# Altium schematic symbol library TI - ADC.SchLib: 2198 symbols (part 22 of 130)
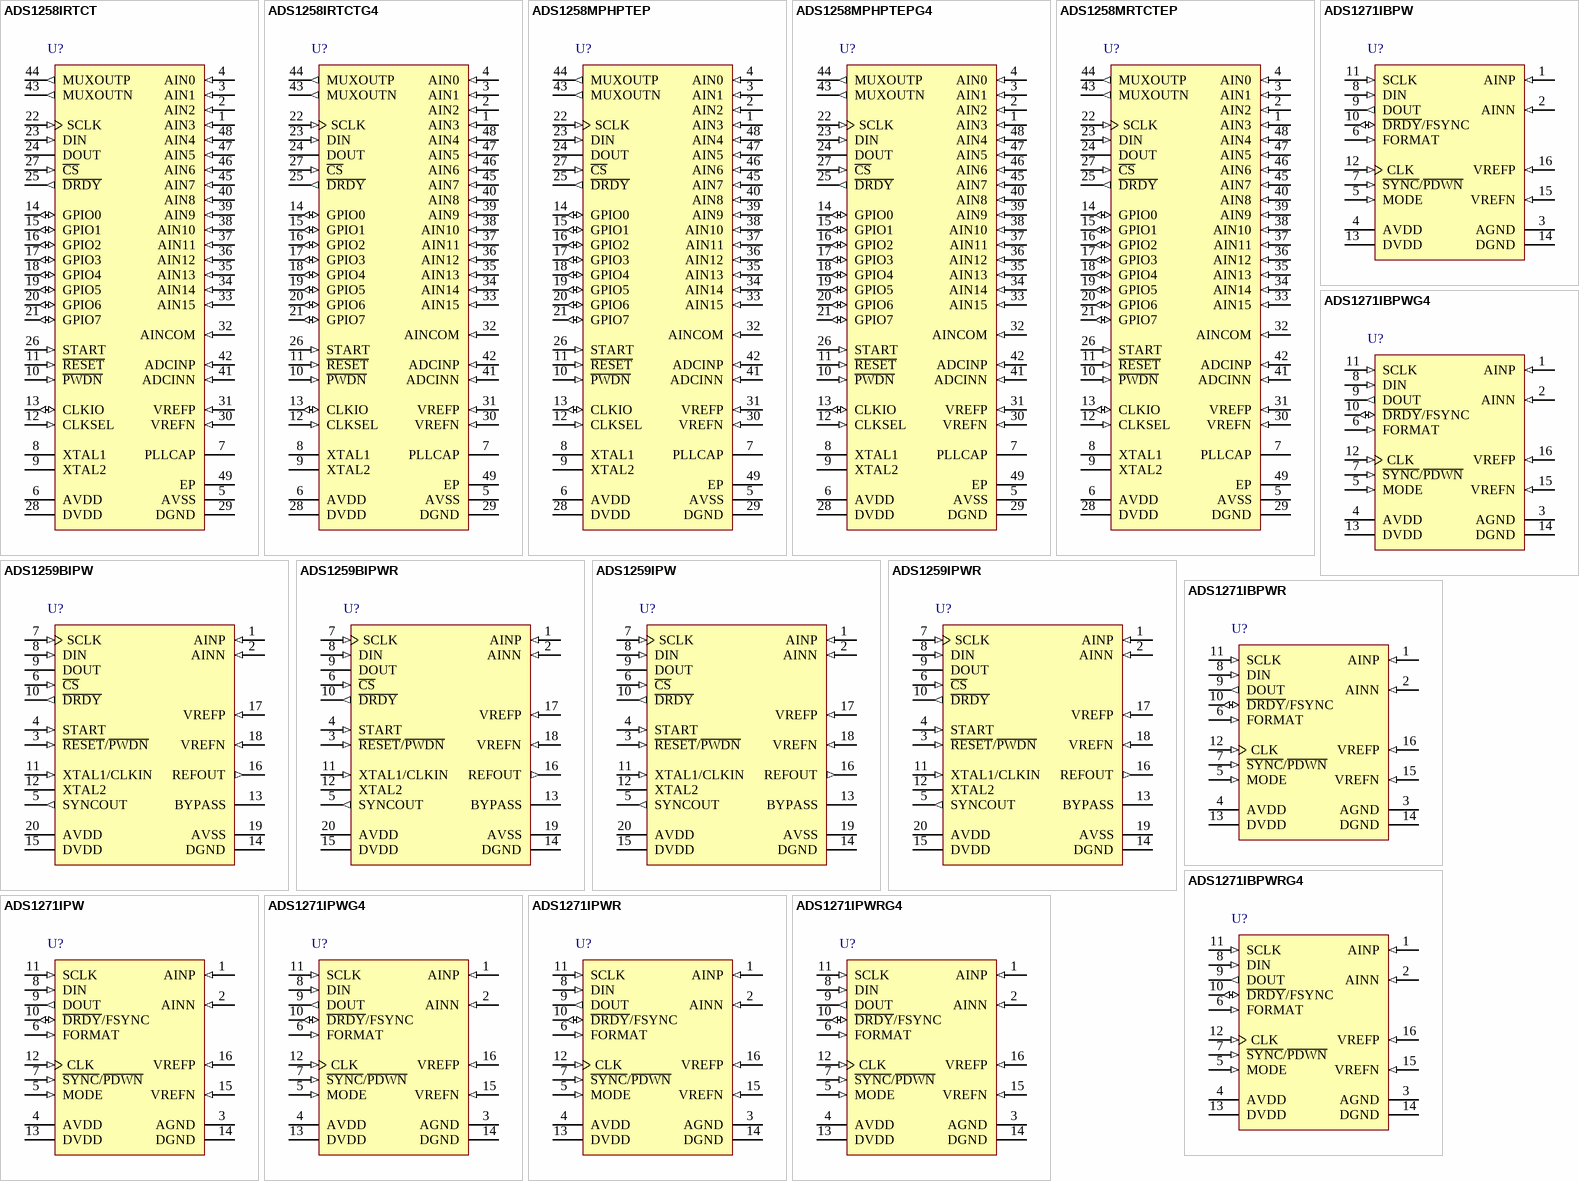
[diagram p147: symbols ADS1258IRTCT to ADS1271IPWRG4]

## ADS1259BIPW
designator U?
Low-Noise, 14 kSPS, 24-Bit ADC, -40 to 105 degC, 20-pin SOP (PW20), Green (RoHS & no Sb/Br); Manufacturer: Texas Instruments; PartNumber: ADS1259BIPW; # Input Channels: 1; Analog Voltage AV/DD(Max)(V): 5.25; Analog Voltage AV/DD(Min)(V): 4.75; Architecture: Delta-Sigma; Digital Supply(Min)(V): 2.7; Interface: Serial SPI; Resolution(Bits): 24; Sample Rate (max)(SPS): 14.4K; SubFamily: Precision ADC (<=10MSPS); DatasheetVersion: SBAS424D; PackageVersion: 4040064-5/G, 02/2011; PackageReference: PW20; PackageDescription: 20-Pin Plastic Small Outline, Body 6.5 x 4.4 mm, Pitch 0.65 mm; Supplier 1: Digi-Key; Supplier Part Number 1: TLC3548IPWRG4-ND; Digital Supply(Max)(V): 5.25; Eco-Plan: Green (RoHS & no Sb/Br); Mounting Technology: Surface Mount; Code_JEDEC: MO-153; ComponentLink1Description: Manufacturer URL; ComponentLink1URL: http://www.ti.com/; ComponentLink2Description: Datasheet; ComponentLink2URL: http://www.ti.com/general/docs/lit/getliterature.tsp?genericPartNumber=ADS1259&fileType=pdf; ComponentLink3Description: Package Specification; ComponentLink3URL: http://www.ti.com.cn/cn/lit/ml/mpds362/mpds362.pdf
footprint TI-PW20_N (SOP, 20-Leads, Body 6.5x4.4mm, Pitch 0.65mm, IPC Medium Density)
footprint TI-PW20_L (SOP, 20-Leads, Body 6.5x4.4mm, Pitch 0.65mm, IPC High Density)
footprint TI-PW20_M (SOP, 20-Leads, Body 6.5x4.4mm, Pitch 0.65mm, IPC Low Density)
pins: 1 AINP (in) "Positive analog input", 2 AINN (in) "Negative analog input", 3 ~{RESET}/~{PWDN} (in), 4 START (in) "Start conversions, active high", 5 SYNCOUT (out) "Sync clock output (fCLK/8)", 6 ~{CS} (in) "SPI chip-select, active low", 7 SCLK (in) "SPI clock input", 8 DIN (in) "SPI data input", 9 DOUT (hiz) "SPI data output", 10 ~{DRDY} (out) "Data ready output, active low", 11 XTAL1/CLKIN (in), 12 XTAL2 "External crystal2, otherwise no connection", 13 BYPASS "Core voltage bypass", 14 DGND (power) "Digital ground", 15 DVDD (power) "Digital power supply", 16 REFOUT (out) "Positive reference output", 17 VREFP (in) "Positive reference input", 18 VREFN (in) "Negative reference input", 19 AVSS (power) "Negative analog power supply and negative reference output", 20 AVDD (power) "Positive analog power supply"

## ADS1259BIPWR
designator U?
Low-Noise, 14 kSPS, 24-Bit ADC, -40 to 105 degC, 20-pin SOP (PW20), Green (RoHS & no Sb/Br); Manufacturer: Texas Instruments; PartNumber: ADS1259BIPWR; # Input Channels: 1; Analog Voltage AV/DD(Max)(V): 5.25; Analog Voltage AV/DD(Min)(V): 4.75; Architecture: Delta-Sigma; Digital Supply(Min)(V): 2.7; Interface: Serial SPI; Resolution(Bits): 24; Sample Rate (max)(SPS): 14.4K; SubFamily: Precision ADC (<=10MSPS); DatasheetVersion: SBAS424D; PackageVersion: 4040064-5/G, 02/2011; PackageReference: PW20; PackageDescription: 20-Pin Plastic Small Outline, Body 6.5 x 4.4 mm, Pitch 0.65 mm; Supplier 1: Digi-Key; Supplier Part Number 1: 296-2988-5-ND; Digital Supply(Max)(V): 5.25; Eco-Plan: Green (RoHS & no Sb/Br); Mounting Technology: Surface Mount; Code_JEDEC: MO-153; ComponentLink1Description: Manufacturer URL; ComponentLink1URL: http://www.ti.com/; ComponentLink2Description: Datasheet; ComponentLink2URL: http://www.ti.com/general/docs/lit/getliterature.tsp?genericPartNumber=ADS1259&fileType=pdf; ComponentLink3Description: Package Specification; ComponentLink3URL: http://www.ti.com.cn/cn/lit/ml/mpds362/mpds362.pdf
footprint TI-PW20_N (SOP, 20-Leads, Body 6.5x4.4mm, Pitch 0.65mm, IPC Medium Density)
footprint TI-PW20_L (SOP, 20-Leads, Body 6.5x4.4mm, Pitch 0.65mm, IPC High Density)
footprint TI-PW20_M (SOP, 20-Leads, Body 6.5x4.4mm, Pitch 0.65mm, IPC Low Density)
pins: 1 AINP (in) "Positive analog input", 2 AINN (in) "Negative analog input", 3 ~{RESET}/~{PWDN} (in), 4 START (in) "Start conversions, active high", 5 SYNCOUT (out) "Sync clock output (fCLK/8)", 6 ~{CS} (in) "SPI chip-select, active low", 7 SCLK (in) "SPI clock input", 8 DIN (in) "SPI data input", 9 DOUT (hiz) "SPI data output", 10 ~{DRDY} (out) "Data ready output, active low", 11 XTAL1/CLKIN (in), 12 XTAL2 "External crystal2, otherwise no connection", 13 BYPASS "Core voltage bypass", 14 DGND (power) "Digital ground", 15 DVDD (power) "Digital power supply", 16 REFOUT (out) "Positive reference output", 17 VREFP (in) "Positive reference input", 18 VREFN (in) "Negative reference input", 19 AVSS (power) "Negative analog power supply and negative reference output", 20 AVDD (power) "Positive analog power supply"

## ADS1259IPW
designator U?
Low-Noise, 14 kSPS, 24-Bit ADC, -40 to 105 degC, 20-pin SOP (PW20), Green (RoHS & no Sb/Br); Manufacturer: Texas Instruments; PartNumber: ADS1259IPW; # Input Channels: 1; Analog Voltage AV/DD(Max)(V): 5.25; Analog Voltage AV/DD(Min)(V): 4.75; Architecture: Delta-Sigma; Digital Supply(Min)(V): 2.7; Interface: Serial SPI; Resolution(Bits): 24; Sample Rate (max)(SPS): 14.4K; SubFamily: Precision ADC (<=10MSPS); DatasheetVersion: SBAS424D; PackageVersion: 4040064-5/G, 02/2011; PackageReference: PW20; PackageDescription: 20-Pin Plastic Small Outline, Body 6.5 x 4.4 mm, Pitch 0.65 mm; Supplier 1: Digi-Key; Supplier Part Number 1: TLV571IPWG4-ND; Digital Supply(Max)(V): 5.25; Eco-Plan: Green (RoHS & no Sb/Br); Mounting Technology: Surface Mount; Code_JEDEC: MO-153; ComponentLink1Description: Manufacturer URL; ComponentLink1URL: http://www.ti.com/; ComponentLink2Description: Datasheet; ComponentLink2URL: http://www.ti.com/general/docs/lit/getliterature.tsp?genericPartNumber=ADS1259&fileType=pdf; ComponentLink3Description: Package Specification; ComponentLink3URL: http://www.ti.com.cn/cn/lit/ml/mpds362/mpds362.pdf
footprint TI-PW20_N (SOP, 20-Leads, Body 6.5x4.4mm, Pitch 0.65mm, IPC Medium Density)
footprint TI-PW20_L (SOP, 20-Leads, Body 6.5x4.4mm, Pitch 0.65mm, IPC High Density)
footprint TI-PW20_M (SOP, 20-Leads, Body 6.5x4.4mm, Pitch 0.65mm, IPC Low Density)
pins: 1 AINP (in) "Positive analog input", 2 AINN (in) "Negative analog input", 3 ~{RESET}/~{PWDN} (in), 4 START (in) "Start conversions, active high", 5 SYNCOUT (out) "Sync clock output (fCLK/8)", 6 ~{CS} (in) "SPI chip-select, active low", 7 SCLK (in) "SPI clock input", 8 DIN (in) "SPI data input", 9 DOUT (hiz) "SPI data output", 10 ~{DRDY} (out) "Data ready output, active low", 11 XTAL1/CLKIN (in), 12 XTAL2 "External crystal2, otherwise no connection", 13 BYPASS "Core voltage bypass", 14 DGND (power) "Digital ground", 15 DVDD (power) "Digital power supply", 16 REFOUT (out) "Positive reference output", 17 VREFP (in) "Positive reference input", 18 VREFN (in) "Negative reference input", 19 AVSS (power) "Negative analog power supply and negative reference output", 20 AVDD (power) "Positive analog power supply"

## ADS1259IPWR
designator U?
Low-Noise, 14 kSPS, 24-Bit ADC, -40 to 105 degC, 20-pin SOP (PW20), Green (RoHS & no Sb/Br); Manufacturer: Texas Instruments; PartNumber: ADS1259IPWR; # Input Channels: 1; Analog Voltage AV/DD(Max)(V): 5.25; Analog Voltage AV/DD(Min)(V): 4.75; Architecture: Delta-Sigma; Digital Supply(Min)(V): 2.7; Interface: Serial SPI; Resolution(Bits): 24; Sample Rate (max)(SPS): 14.4K; SubFamily: Precision ADC (<=10MSPS); DatasheetVersion: SBAS424D; PackageVersion: 4040064-5/G, 02/2011; PackageReference: PW20; PackageDescription: 20-Pin Plastic Small Outline, Body 6.5 x 4.4 mm, Pitch 0.65 mm; Supplier 1: Digi-Key; Supplier Part Number 1: ADS1205IRGER-ND; Digital Supply(Max)(V): 5.25; Eco-Plan: Green (RoHS & no Sb/Br); Mounting Technology: Surface Mount; Code_JEDEC: MO-153; ComponentLink1Description: Manufacturer URL; ComponentLink1URL: http://www.ti.com/; ComponentLink2Description: Datasheet; ComponentLink2URL: http://www.ti.com/general/docs/lit/getliterature.tsp?genericPartNumber=ADS1259&fileType=pdf; ComponentLink3Description: Package Specification; ComponentLink3URL: http://www.ti.com.cn/cn/lit/ml/mpds362/mpds362.pdf
footprint TI-PW20_N (SOP, 20-Leads, Body 6.5x4.4mm, Pitch 0.65mm, IPC Medium Density)
footprint TI-PW20_L (SOP, 20-Leads, Body 6.5x4.4mm, Pitch 0.65mm, IPC High Density)
footprint TI-PW20_M (SOP, 20-Leads, Body 6.5x4.4mm, Pitch 0.65mm, IPC Low Density)
pins: 1 AINP (in) "Positive analog input", 2 AINN (in) "Negative analog input", 3 ~{RESET}/~{PWDN} (in), 4 START (in) "Start conversions, active high", 5 SYNCOUT (out) "Sync clock output (fCLK/8)", 6 ~{CS} (in) "SPI chip-select, active low", 7 SCLK (in) "SPI clock input", 8 DIN (in) "SPI data input", 9 DOUT (hiz) "SPI data output", 10 ~{DRDY} (out) "Data ready output, active low", 11 XTAL1/CLKIN (in), 12 XTAL2 "External crystal2, otherwise no connection", 13 BYPASS "Core voltage bypass", 14 DGND (power) "Digital ground", 15 DVDD (power) "Digital power supply", 16 REFOUT (out) "Positive reference output", 17 VREFP (in) "Positive reference input", 18 VREFN (in) "Negative reference input", 19 AVSS (power) "Negative analog power supply and negative reference output", 20 AVDD (power) "Positive analog power supply"

## ADS1271IBPW
designator U?
24-Bit, 105 kSPS Industrial Delta-Sigma ADC, -40 to 105 degC, 16-pin SOP (PW16), Green (RoHS & no Sb/Br); Manufacturer: Texas Instruments; PartNumber: ADS1271IBPW; # Input Channels: 1; Analog Voltage AV/DD(Max)(V): 5.25; Analog Voltage AV/DD(Min)(V): 4.75; Digital Supply(Max)(V): 3.6; Digital Supply(Min)(V): 1.65; Interface: Serial SPI; Resolution(Bits): 24; Sample Rate (max)(SPS): 105k; SFDR(dB): 109; SubFamily: Precision ADC (<=10MSPS); DatasheetVersion: SBAS306F; PackageVersion: 4040064-4/G, 02/2011; PackageReference: PW16; PackageDescription: 16-Pin Plastic Small Outline, Body 5 x 4.4 mm, Pitch 0.65 mm; Supplier 1: Digi-Key; Supplier Part Number 1: ADS1205IRGERG4-ND; Architecture: Delta-Sigma; Eco-Plan: Green (RoHS & no Sb/Br); SNR(dB): 109; Mounting Technology: Surface Mount; Code_JEDEC: MO-153; ComponentLink1Description: Manufacturer URL; ComponentLink1URL: http://www.ti.com/; ComponentLink2Description: Datasheet; ComponentLink2URL: http://www.ti.com/general/docs/lit/getliterature.tsp?genericPartNumber=ADS1271&fileType=pdf; ComponentLink3Description: Package Specification; ComponentLink3URL: http://www.ti.com/lit/ml/mpds361/mpds361.pdf
footprint TI-PW16_N (SOP, 16-Leads, Body 5x4.4mm, Pitch 0.65mm, IPC Medium Density)
footprint TI-PW16_L (SOP, 16-Leads, Body 5x4.4mm, Pitch 0.65mm, IPC High Density)
footprint TI-PW16_M (SOP, 16-Leads, Body 5x4.4mm, Pitch 0.65mm, IPC Low Density)
pins: 1 AINP (in) "Positive analog input", 2 AINN (in) "Negative analog input", 3 AGND (power) "Analog ground", 4 AVDD (power) "Analog supply", 5 MODE (in) "MODE = 0: High-Speed mode;MODE = float: High-Resolution mode;MODE = 1: Low-Power mode", 6 FORMAT (in) "FORMAT = 0: SPI;FORMAT = float: Modulator output (ADS1271B only);FORMAT = 1: Frame-Sync", 7 ~{SYNC}/~{PDWN} (in) "Synchronize/Power-down input, active low", 8 DIN (in) "Data input for daisy-chain operation", 9 DOUT (out) "ADC data output, modulator output (modulator mode)", 10 ~{DRDY}/FSYNC (io) "If FORMAT = 0 (SPI), then pin 10 = D\R\D\Y\ output;If FORMAT = 1 (Frame-Sync), then pin 10 = FSYNC input", 11 SCLK (in) "Serial clock for ADC data retrieval, modulator clock output (modulator mode)", 12 CLK (in) "Master clock", 13 DVDD (power) "Digital supply", 14 DGND (power) "Digital ground", 15 VREFN (in) "Negative reference input", 16 VREFP (in) "Positive reference input"

## ADS1271IBPWG4
designator U?
24-Bit, 105 kSPS Industrial Delta-Sigma ADC, -40 to 105 degC, 16-pin SOP (PW16), Green (RoHS & no Sb/Br); Manufacturer: Texas Instruments; PartNumber: ADS1271IBPWG4; # Input Channels: 1; Analog Voltage AV/DD(Max)(V): 5.25; Analog Voltage AV/DD(Min)(V): 4.75; Digital Supply(Max)(V): 3.6; Digital Supply(Min)(V): 1.65; Interface: Serial SPI; Resolution(Bits): 24; Sample Rate (max)(SPS): 105k; SFDR(dB): 109; SubFamily: Precision ADC (<=10MSPS); DatasheetVersion: SBAS306F; PackageVersion: 4040064-4/G, 02/2011; PackageReference: PW16; PackageDescription: 16-Pin Plastic Small Outline, Body 5 x 4.4 mm, Pitch 0.65 mm; Supplier 1: Digi-Key; Supplier Part Number 1: 296-18193-2-ND; Architecture: Delta-Sigma; Eco-Plan: Green (RoHS & no Sb/Br); SNR(dB): 109; Mounting Technology: Surface Mount; Code_JEDEC: MO-153; ComponentLink1Description: Manufacturer URL; ComponentLink1URL: http://www.ti.com/; ComponentLink2Description: Datasheet; ComponentLink2URL: http://www.ti.com/general/docs/lit/getliterature.tsp?genericPartNumber=ADS1271&fileType=pdf; ComponentLink3Description: Package Specification; ComponentLink3URL: http://www.ti.com/lit/ml/mpds361/mpds361.pdf
footprint TI-PW16_N (SOP, 16-Leads, Body 5x4.4mm, Pitch 0.65mm, IPC Medium Density)
footprint TI-PW16_L (SOP, 16-Leads, Body 5x4.4mm, Pitch 0.65mm, IPC High Density)
footprint TI-PW16_M (SOP, 16-Leads, Body 5x4.4mm, Pitch 0.65mm, IPC Low Density)
pins: 1 AINP (in) "Positive analog input", 2 AINN (in) "Negative analog input", 3 AGND (power) "Analog ground", 4 AVDD (power) "Analog supply", 5 MODE (in) "MODE = 0: High-Speed mode;MODE = float: High-Resolution mode;MODE = 1: Low-Power mode", 6 FORMAT (in) "FORMAT = 0: SPI;FORMAT = float: Modulator output (ADS1271B only);FORMAT = 1: Frame-Sync", 7 ~{SYNC}/~{PDWN} (in) "Synchronize/Power-down input, active low", 8 DIN (in) "Data input for daisy-chain operation", 9 DOUT (out) "ADC data output, modulator output (modulator mode)", 10 ~{DRDY}/FSYNC (io) "If FORMAT = 0 (SPI), then pin 10 = D\R\D\Y\ output;If FORMAT = 1 (Frame-Sync), then pin 10 = FSYNC input", 11 SCLK (in) "Serial clock for ADC data retrieval, modulator clock output (modulator mode)", 12 CLK (in) "Master clock", 13 DVDD (power) "Digital supply", 14 DGND (power) "Digital ground", 15 VREFN (in) "Negative reference input", 16 VREFP (in) "Positive reference input"

## ADS1271IBPWR
designator U?
24-Bit, 105 kSPS Industrial Delta-Sigma ADC, -40 to 105 degC, 16-pin SOP (PW16), Green (RoHS & no Sb/Br); Manufacturer: Texas Instruments; PartNumber: ADS1271IBPWR; # Input Channels: 1; Analog Voltage AV/DD(Max)(V): 5.25; Analog Voltage AV/DD(Min)(V): 4.75; Digital Supply(Max)(V): 3.6; Digital Supply(Min)(V): 1.65; Interface: Serial SPI; Resolution(Bits): 24; Sample Rate (max)(SPS): 105k; SFDR(dB): 109; SubFamily: Precision ADC (<=10MSPS); DatasheetVersion: SBAS306F; PackageVersion: 4040064-4/G, 02/2011; PackageReference: PW16; PackageDescription: 16-Pin Plastic Small Outline, Body 5 x 4.4 mm, Pitch 0.65 mm; Supplier 1: Digi-Key; Supplier Part Number 1: ADS1205IRGETG4-ND; Architecture: Delta-Sigma; Eco-Plan: Green (RoHS & no Sb/Br); SNR(dB): 109; Mounting Technology: Surface Mount; Code_JEDEC: MO-153; ComponentLink1Description: Manufacturer URL; ComponentLink1URL: http://www.ti.com/; ComponentLink2Description: Datasheet; ComponentLink2URL: http://www.ti.com/general/docs/lit/getliterature.tsp?genericPartNumber=ADS1271&fileType=pdf; ComponentLink3Description: Package Specification; ComponentLink3URL: http://www.ti.com/lit/ml/mpds361/mpds361.pdf
footprint TI-PW16_N (SOP, 16-Leads, Body 5x4.4mm, Pitch 0.65mm, IPC Medium Density)
footprint TI-PW16_L (SOP, 16-Leads, Body 5x4.4mm, Pitch 0.65mm, IPC High Density)
footprint TI-PW16_M (SOP, 16-Leads, Body 5x4.4mm, Pitch 0.65mm, IPC Low Density)
pins: 1 AINP (in) "Positive analog input", 2 AINN (in) "Negative analog input", 3 AGND (power) "Analog ground", 4 AVDD (power) "Analog supply", 5 MODE (in) "MODE = 0: High-Speed mode;MODE = float: High-Resolution mode;MODE = 1: Low-Power mode", 6 FORMAT (in) "FORMAT = 0: SPI;FORMAT = float: Modulator output (ADS1271B only);FORMAT = 1: Frame-Sync", 7 ~{SYNC}/~{PDWN} (in) "Synchronize/Power-down input, active low", 8 DIN (in) "Data input for daisy-chain operation", 9 DOUT (out) "ADC data output, modulator output (modulator mode)", 10 ~{DRDY}/FSYNC (io) "If FORMAT = 0 (SPI), then pin 10 = D\R\D\Y\ output;If FORMAT = 1 (Frame-Sync), then pin 10 = FSYNC input", 11 SCLK (in) "Serial clock for ADC data retrieval, modulator clock output (modulator mode)", 12 CLK (in) "Master clock", 13 DVDD (power) "Digital supply", 14 DGND (power) "Digital ground", 15 VREFN (in) "Negative reference input", 16 VREFP (in) "Positive reference input"

## ADS1271IBPWRG4
designator U?
24-Bit, 105 kSPS Industrial Delta-Sigma ADC, -40 to 105 degC, 16-pin SOP (PW16), Green (RoHS & no Sb/Br); Manufacturer: Texas Instruments; PartNumber: ADS1271IBPWRG4; # Input Channels: 1; Analog Voltage AV/DD(Max)(V): 5.25; Analog Voltage AV/DD(Min)(V): 4.75; Digital Supply(Max)(V): 3.6; Digital Supply(Min)(V): 1.65; Interface: Serial SPI; Resolution(Bits): 24; Sample Rate (max)(SPS): 105k; SFDR(dB): 109; SubFamily: Precision ADC (<=10MSPS); DatasheetVersion: SBAS306F; PackageVersion: 4040064-4/G, 02/2011; PackageReference: PW16; PackageDescription: 16-Pin Plastic Small Outline, Body 5 x 4.4 mm, Pitch 0.65 mm; Supplier 1: Digi-Key; Supplier Part Number 1: 296-18676-5-ND; Architecture: Delta-Sigma; Eco-Plan: Green (RoHS & no Sb/Br); SNR(dB): 109; Mounting Technology: Surface Mount; Code_JEDEC: MO-153; ComponentLink1Description: Manufacturer URL; ComponentLink1URL: http://www.ti.com/; ComponentLink2Description: Datasheet; ComponentLink2URL: http://www.ti.com/general/docs/lit/getliterature.tsp?genericPartNumber=ADS1271&fileType=pdf; ComponentLink3Description: Package Specification; ComponentLink3URL: http://www.ti.com/lit/ml/mpds361/mpds361.pdf
footprint TI-PW16_N (SOP, 16-Leads, Body 5x4.4mm, Pitch 0.65mm, IPC Medium Density)
footprint TI-PW16_L (SOP, 16-Leads, Body 5x4.4mm, Pitch 0.65mm, IPC High Density)
footprint TI-PW16_M (SOP, 16-Leads, Body 5x4.4mm, Pitch 0.65mm, IPC Low Density)
pins: 1 AINP (in) "Positive analog input", 2 AINN (in) "Negative analog input", 3 AGND (power) "Analog ground", 4 AVDD (power) "Analog supply", 5 MODE (in) "MODE = 0: High-Speed mode;MODE = float: High-Resolution mode;MODE = 1: Low-Power mode", 6 FORMAT (in) "FORMAT = 0: SPI;FORMAT = float: Modulator output (ADS1271B only);FORMAT = 1: Frame-Sync", 7 ~{SYNC}/~{PDWN} (in) "Synchronize/Power-down input, active low", 8 DIN (in) "Data input for daisy-chain operation", 9 DOUT (out) "ADC data output, modulator output (modulator mode)", 10 ~{DRDY}/FSYNC (io) "If FORMAT = 0 (SPI), then pin 10 = D\R\D\Y\ output;If FORMAT = 1 (Frame-Sync), then pin 10 = FSYNC input", 11 SCLK (in) "Serial clock for ADC data retrieval, modulator clock output (modulator mode)", 12 CLK (in) "Master clock", 13 DVDD (power) "Digital supply", 14 DGND (power) "Digital ground", 15 VREFN (in) "Negative reference input", 16 VREFP (in) "Positive reference input"

## ADS1271IPW
designator U?
24-Bit, 105 kSPS Industrial Delta-Sigma ADC, -40 to 125 degC, 16-pin SOP (PW16), Green (RoHS & no Sb/Br); Manufacturer: Texas Instruments; PartNumber: ADS1271IPW; # Input Channels: 1; Analog Voltage AV/DD(Max)(V): 5.25; Analog Voltage AV/DD(Min)(V): 4.75; Digital Supply(Max)(V): 3.6; Digital Supply(Min)(V): 1.65; Interface: Serial SPI; Resolution(Bits): 24; Sample Rate (max)(SPS): 105k; SFDR(dB): 108; SNR(dB): 109; SubFamily: Precision ADC (<=10MSPS); DatasheetVersion: SBAS306F; PackageVersion: 4040064-4/G, 02/2011; PackageReference: PW16; PackageDescription: 16-Pin Plastic Small Outline, Body 5 x 4.4 mm, Pitch 0.65 mm; Supplier 1: Digi-Key; Supplier Part Number 1: ADS8505IBDWG4-ND; Architecture: Delta-Sigma; Eco-Plan: Green (RoHS & no Sb/Br); Mounting Technology: Surface Mount; Code_JEDEC: MO-153; ComponentLink1Description: Manufacturer URL; ComponentLink1URL: http://www.ti.com/; ComponentLink2Description: Datasheet; ComponentLink2URL: http://www.ti.com/general/docs/lit/getliterature.tsp?genericPartNumber=ADS1271&fileType=pdf; ComponentLink3Description: Package Specification; ComponentLink3URL: http://www.ti.com/lit/ml/mpds361/mpds361.pdf
footprint TI-PW16_N (SOP, 16-Leads, Body 5x4.4mm, Pitch 0.65mm, IPC Medium Density)
footprint TI-PW16_L (SOP, 16-Leads, Body 5x4.4mm, Pitch 0.65mm, IPC High Density)
footprint TI-PW16_M (SOP, 16-Leads, Body 5x4.4mm, Pitch 0.65mm, IPC Low Density)
pins: 1 AINP (in) "Positive analog input", 2 AINN (in) "Negative analog input", 3 AGND (power) "Analog ground", 4 AVDD (power) "Analog supply", 5 MODE (in) "MODE = 0: High-Speed mode;MODE = float: High-Resolution mode;MODE = 1: Low-Power mode", 6 FORMAT (in) "FORMAT = 0: SPI;FORMAT = float: Modulator output (ADS1271B only);FORMAT = 1: Frame-Sync", 7 ~{SYNC}/~{PDWN} (in) "Synchronize/Power-down input, active low", 8 DIN (in) "Data input for daisy-chain operation", 9 DOUT (out) "ADC data output, modulator output (modulator mode)", 10 ~{DRDY}/FSYNC (io) "If FORMAT = 0 (SPI), then pin 10 = D\R\D\Y\ output;If FORMAT = 1 (Frame-Sync), then pin 10 = FSYNC input", 11 SCLK (in) "Serial clock for ADC data retrieval, modulator clock output (modulator mode)", 12 CLK (in) "Master clock", 13 DVDD (power) "Digital supply", 14 DGND (power) "Digital ground", 15 VREFN (in) "Negative reference input", 16 VREFP (in) "Positive reference input"

## ADS1271IPWG4
designator U?
24-Bit, 105 kSPS Industrial Delta-Sigma ADC, -40 to 125 degC, 16-pin SOP (PW16), Green (RoHS & no Sb/Br); Manufacturer: Texas Instruments; PartNumber: ADS1271IPWG4; # Input Channels: 1; Analog Voltage AV/DD(Max)(V): 5.25; Analog Voltage AV/DD(Min)(V): 4.75; Digital Supply(Max)(V): 3.6; Digital Supply(Min)(V): 1.65; Interface: Serial SPI; Resolution(Bits): 24; Sample Rate (max)(SPS): 105k; SFDR(dB): 108; SNR(dB): 109; SubFamily: Precision ADC (<=10MSPS); DatasheetVersion: SBAS306F; PackageVersion: 4040064-4/G, 02/2011; PackageReference: PW16; PackageDescription: 16-Pin Plastic Small Outline, Body 5 x 4.4 mm, Pitch 0.65 mm; Supplier 1: Digi-Key; Supplier Part Number 1: ADS8505IBDWR-ND; Architecture: Delta-Sigma; Eco-Plan: Green (RoHS & no Sb/Br); Mounting Technology: Surface Mount; Code_JEDEC: MO-153; ComponentLink1Description: Manufacturer URL; ComponentLink1URL: http://www.ti.com/; ComponentLink2Description: Datasheet; ComponentLink2URL: http://www.ti.com/general/docs/lit/getliterature.tsp?genericPartNumber=ADS1271&fileType=pdf; ComponentLink3Description: Package Specification; ComponentLink3URL: http://www.ti.com/lit/ml/mpds361/mpds361.pdf
footprint TI-PW16_N (SOP, 16-Leads, Body 5x4.4mm, Pitch 0.65mm, IPC Medium Density)
footprint TI-PW16_L (SOP, 16-Leads, Body 5x4.4mm, Pitch 0.65mm, IPC High Density)
footprint TI-PW16_M (SOP, 16-Leads, Body 5x4.4mm, Pitch 0.65mm, IPC Low Density)
pins: 1 AINP (in) "Positive analog input", 2 AINN (in) "Negative analog input", 3 AGND (power) "Analog ground", 4 AVDD (power) "Analog supply", 5 MODE (in) "MODE = 0: High-Speed mode;MODE = float: High-Resolution mode;MODE = 1: Low-Power mode", 6 FORMAT (in) "FORMAT = 0: SPI;FORMAT = float: Modulator output (ADS1271B only);FORMAT = 1: Frame-Sync", 7 ~{SYNC}/~{PDWN} (in) "Synchronize/Power-down input, active low", 8 DIN (in) "Data input for daisy-chain operation", 9 DOUT (out) "ADC data output, modulator output (modulator mode)", 10 ~{DRDY}/FSYNC (io) "If FORMAT = 0 (SPI), then pin 10 = D\R\D\Y\ output;If FORMAT = 1 (Frame-Sync), then pin 10 = FSYNC input", 11 SCLK (in) "Serial clock for ADC data retrieval, modulator clock output (modulator mode)", 12 CLK (in) "Master clock", 13 DVDD (power) "Digital supply", 14 DGND (power) "Digital ground", 15 VREFN (in) "Negative reference input", 16 VREFP (in) "Positive reference input"

## ADS1271IPWR
designator U?
24-Bit, 105 kSPS Industrial Delta-Sigma ADC, -40 to 125 degC, 16-pin SOP (PW16), Green (RoHS & no Sb/Br); Manufacturer: Texas Instruments; PartNumber: ADS1271IPWR; # Input Channels: 1; Analog Voltage AV/DD(Max)(V): 5.25; Analog Voltage AV/DD(Min)(V): 4.75; Digital Supply(Max)(V): 3.6; Digital Supply(Min)(V): 1.65; Interface: Serial SPI; Resolution(Bits): 24; Sample Rate (max)(SPS): 105k; SFDR(dB): 108; SNR(dB): 109; SubFamily: Precision ADC (<=10MSPS); DatasheetVersion: SBAS306F; PackageVersion: 4040064-4/G, 02/2011; PackageReference: PW16; PackageDescription: 16-Pin Plastic Small Outline, Body 5 x 4.4 mm, Pitch 0.65 mm; Supplier 1: Digi-Key; Supplier Part Number 1: ADS8505IBDWRG4-ND; Architecture: Delta-Sigma; Eco-Plan: Green (RoHS & no Sb/Br); Mounting Technology: Surface Mount; Code_JEDEC: MO-153; ComponentLink1Description: Manufacturer URL; ComponentLink1URL: http://www.ti.com/; ComponentLink2Description: Datasheet; ComponentLink2URL: http://www.ti.com/general/docs/lit/getliterature.tsp?genericPartNumber=ADS1271&fileType=pdf; ComponentLink3Description: Package Specification; ComponentLink3URL: http://www.ti.com/lit/ml/mpds361/mpds361.pdf
footprint TI-PW16_N (SOP, 16-Leads, Body 5x4.4mm, Pitch 0.65mm, IPC Medium Density)
footprint TI-PW16_L (SOP, 16-Leads, Body 5x4.4mm, Pitch 0.65mm, IPC High Density)
footprint TI-PW16_M (SOP, 16-Leads, Body 5x4.4mm, Pitch 0.65mm, IPC Low Density)
pins: 1 AINP (in) "Positive analog input", 2 AINN (in) "Negative analog input", 3 AGND (power) "Analog ground", 4 AVDD (power) "Analog supply", 5 MODE (in) "MODE = 0: High-Speed mode;MODE = float: High-Resolution mode;MODE = 1: Low-Power mode", 6 FORMAT (in) "FORMAT = 0: SPI;FORMAT = float: Modulator output (ADS1271B only);FORMAT = 1: Frame-Sync", 7 ~{SYNC}/~{PDWN} (in) "Synchronize/Power-down input, active low", 8 DIN (in) "Data input for daisy-chain operation", 9 DOUT (out) "ADC data output, modulator output (modulator mode)", 10 ~{DRDY}/FSYNC (io) "If FORMAT = 0 (SPI), then pin 10 = D\R\D\Y\ output;If FORMAT = 1 (Frame-Sync), then pin 10 = FSYNC input", 11 SCLK (in) "Serial clock for ADC data retrieval, modulator clock output (modulator mode)", 12 CLK (in) "Master clock", 13 DVDD (power) "Digital supply", 14 DGND (power) "Digital ground", 15 VREFN (in) "Negative reference input", 16 VREFP (in) "Positive reference input"

## ADS1271IPWRG4
designator U?
24-Bit, 105 kSPS Industrial Delta-Sigma ADC, -40 to 125 degC, 16-pin SOP (PW16), Green (RoHS & no Sb/Br); Manufacturer: Texas Instruments; PartNumber: ADS1271IPWRG4; # Input Channels: 1; Analog Voltage AV/DD(Max)(V): 5.25; Analog Voltage AV/DD(Min)(V): 4.75; Digital Supply(Max)(V): 3.6; Digital Supply(Min)(V): 1.65; Interface: Serial SPI; Resolution(Bits): 24; Sample Rate (max)(SPS): 105k; SFDR(dB): 108; SNR(dB): 109; SubFamily: Precision ADC (<=10MSPS); DatasheetVersion: SBAS306F; PackageVersion: 4040064-4/G, 02/2011; PackageReference: PW16; PackageDescription: 16-Pin Plastic Small Outline, Body 5 x 4.4 mm, Pitch 0.65 mm; Supplier 1: Digi-Key; Supplier Part Number 1: 296-18678-5-ND; Architecture: Delta-Sigma; Eco-Plan: Green (RoHS & no Sb/Br); Mounting Technology: Surface Mount; Code_JEDEC: MO-153; ComponentLink1Description: Manufacturer URL; ComponentLink1URL: http://www.ti.com/; ComponentLink2Description: Datasheet; ComponentLink2URL: http://www.ti.com/general/docs/lit/getliterature.tsp?genericPartNumber=ADS1271&fileType=pdf; ComponentLink3Description: Package Specification; ComponentLink3URL: http://www.ti.com/lit/ml/mpds361/mpds361.pdf
footprint TI-PW16_N (SOP, 16-Leads, Body 5x4.4mm, Pitch 0.65mm, IPC Medium Density)
footprint TI-PW16_L (SOP, 16-Leads, Body 5x4.4mm, Pitch 0.65mm, IPC High Density)
footprint TI-PW16_M (SOP, 16-Leads, Body 5x4.4mm, Pitch 0.65mm, IPC Low Density)
pins: 1 AINP (in) "Positive analog input", 2 AINN (in) "Negative analog input", 3 AGND (power) "Analog ground", 4 AVDD (power) "Analog supply", 5 MODE (in) "MODE = 0: High-Speed mode;MODE = float: High-Resolution mode;MODE = 1: Low-Power mode", 6 FORMAT (in) "FORMAT = 0: SPI;FORMAT = float: Modulator output (ADS1271B only);FORMAT = 1: Frame-Sync", 7 ~{SYNC}/~{PDWN} (in) "Synchronize/Power-down input, active low", 8 DIN (in) "Data input for daisy-chain operation", 9 DOUT (out) "ADC data output, modulator output (modulator mode)", 10 ~{DRDY}/FSYNC (io) "If FORMAT = 0 (SPI), then pin 10 = D\R\D\Y\ output;If FORMAT = 1 (Frame-Sync), then pin 10 = FSYNC input", 11 SCLK (in) "Serial clock for ADC data retrieval, modulator clock output (modulator mode)", 12 CLK (in) "Master clock", 13 DVDD (power) "Digital supply", 14 DGND (power) "Digital ground", 15 VREFN (in) "Negative reference input", 16 VREFP (in) "Positive reference input"
